# Altium footprint library WE Inductors.PcbLib: 131 footprints (part 4 of 9)
Each footprint in its own frame and in the unit in brackets; x right, y up, seen from the top. Pads: shape width x height; smd on the part's side, far side on the other; paste and mask are expansions set on the pad; w line width, h text height; cw(c..) or ccw(c..) is an arc to the next point about the centre after c.
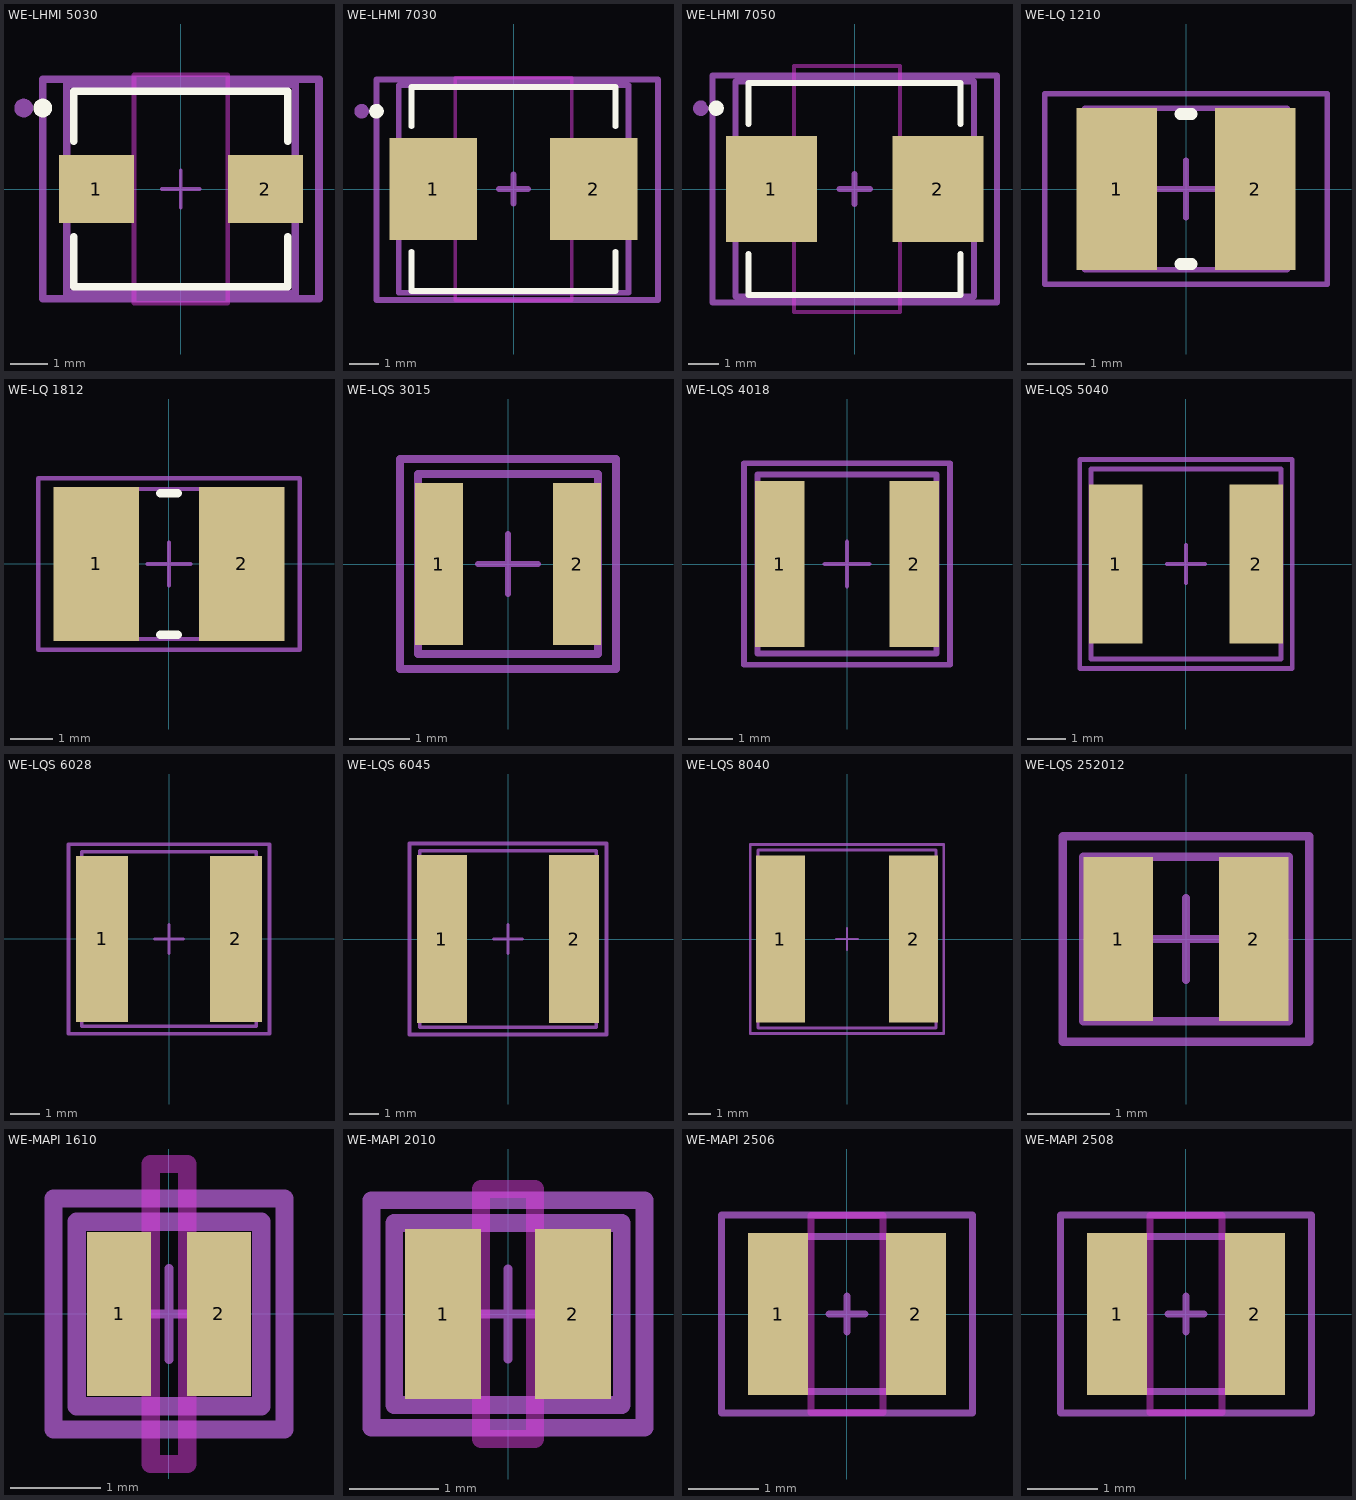
[diagram p3: the footprints below, top view; thin cyan lines are the x and y axes]

## WE-LHMI 5030 [mm] "SMD Inductor, 2-Leads, Body 5.7x 5.2mm"
height 2.8
pads (2):
  rect 2x1.8 smd: 1(-2.25,0) 2(2.25,0)
Top Overlay:
  circle w0.25: c-3.683,2.159 r0.125
  lines w0.2: -2.85,-1.27 -2.85,-2.6 2.85,-2.6 2.85,-1.27 ; -2.85,1.27 -2.85,2.6 2.85,2.6 2.85,1.27
Keep-Out Layer:
  lines w0.127: -1.25,-3.048 -1.25,3.048 1.25,3.048 1.25,-3.048 -1.25,-3.048
Mechanical 13:
  lines w0.2: -3.048,-2.794 3.048,-2.794 3.048,2.794 -3.048,2.794 -3.048,-2.794
Mechanical 15:
  circle w0.25: c-4.191,2.159 r0.125
  lines w0.1: -0.5,0 0.5,0 ; 0,-0.5 0,0.5
  lines w0.2: -3.683,-2.921 -3.683,2.921 3.683,2.921 3.683,-2.921 -3.683,-2.921
  text ".Designator" at 0,0 h0.76
3D body: height 2.8, standoff 0, extent -2.85,-2.6 2.85,2.6

## WE-LHMI 7030 [mm] "SMD Inductor, 2-Leads, Body 7.3 x 6.6mm"
height 2.8
pads (2):
  rect 3x3.5 smd: 1(-2.75,0) 2(2.75,0)
Top Overlay:
  circle w0.25: c-4.699,2.667 r0.125
  lines w0.2: -3.5,-2.15 -3.5,-3.5 3.5,-3.5 3.5,-2.15 ; -3.5,2.15 -3.5,3.5 3.5,3.5 3.5,2.15
Keep-Out Layer:
  lines w0.127: -2,-3.81 -2,3.81 2,3.81 2,-3.81 -2,-3.81
Mechanical 13:
  lines w0.2: -3.937,-3.556 -3.937,3.556 3.937,3.556 3.937,-3.556 -3.937,-3.556
Mechanical 15:
  circle w0.25: c-5.207,2.667 r0.125
  lines w0.2: -0.5,0 0.5,0 ; 0,-0.5 0,0.5 ; -4.699,-3.81 -4.699,3.75 4.953,3.75 4.953,-3.81 -4.699,-3.81
  text ".Designator" at 0,0 h0.76
3D body: height 2.8, standoff 0, extent -3.65,-3.3 3.65,3.3

## WE-LHMI 7050 [mm] "SMD Inductor, 2-Leads, Body 7.3 x 6.6mm"
height 4.8
pads (2):
  rect 3x3.5 smd: 1(-2.75,0) 2(2.75,0)
Top Overlay:
  circle w0.25: c-4.572,2.667 r0.125
  lines w0.2: -3.5,-2.15 -3.5,-3.5 3.5,-3.5 3.5,-2.15 ; -3.5,2.15 -3.5,3.5 3.5,3.5 3.5,2.15
Keep-Out Layer:
  lines w0.127: -2,-4.064 1.5,-4.064 1.5,4.064 -2,4.064 -2,-4.064
Mechanical 13:
  lines w0.2: -3.937,-3.556 3.937,-3.556 3.937,3.556 -3.937,3.556 -3.937,-3.556
Mechanical 15:
  lines w0.2: -0.5,0 0.5,0 ; 0,-0.5 0,0.5 ; -4.699,-3.75 4.699,-3.75 4.699,3.75 -4.699,3.75 -4.699,-3.75
  lines w0.254: -5.023,2.781 ccw(c-5.08,2.667) -4.953,2.667
  text ".Designator" at 0,0 h0.76
3D body: height 4.8, standoff 0, extent -3.65,-3.3 3.65,3.3

## WE-LQ 1210 [mm] "Inductor, 2-Leads, Body 3,2x2,5mm"
height 2.3
pads (2):
  rect 1.4x2.8 smd: 1(-1.2,0) 2(1.2,0)
Top Overlay:
  lines w0.2: -0.1,-1.3 0.1,-1.3 ; -0.1,1.3 0.1,1.3
Mechanical 13:
  lines w0.1: -1.75,-1.4 1.75,-1.4 1.75,1.4 -1.75,1.4 -1.75,-1.4
Mechanical 15:
  lines w0.1: -0.5,0 0.5,0 ; 0,-0.5 0,0.5 ; -2.45,-1.65 2.45,-1.65 2.45,1.65 -2.45,1.65 -2.45,-1.65
3D body: height 1.99, standoff -0.01, extent -1.6,-1.25 1.6,1.25

## WE-LQ 1812 [mm] "Inductor, 2-Leads, Body 4,5x3,2mm"
height 2.9
pads (2):
  rect 2x3.6 smd: 1(-1.7,0) 2(1.7,0)
Top Overlay:
  lines w0.2: -0.2,-1.65 0.2,-1.65 ; -0.2,1.65 0.2,1.65
Mechanical 13:
  lines w0.1: -2.4,-1.75 2.4,-1.75 2.4,1.75 -2.4,1.75 -2.4,-1.75
Mechanical 15:
  lines w0.1: -0.5,0 0.5,0 ; 0,-0.5 0,0.5 ; -3.05,-2 3.05,-2 3.05,2 -3.05,2 -3.05,-2
3D body: height 2.59, standoff -0.01, extent -2.25,-1.6 2.25,1.6

## WE-LQS 3015 [mm] "SMD Power Inductor, 2-Leads, Body 3.0x3.0mm"
height 1.5
pads (2):
  rect 0.8x2.7 smd: 1(-1.15,0) 2(1.15,0)
Mechanical 13:
  lines w0.127: -1.5,-1.5 1.5,-1.5 1.5,1.5 -1.5,1.5 -1.5,-1.5
Mechanical 15:
  lines w0.1: -0.5,0 0.5,0 ; 0,-0.5 0,0.5
  lines w0.127: -1.8,-1.75 -1.8,1.75 1.8,1.75 1.8,-1.75 -1.8,-1.75
3D body: height 1.48, standoff -0.02, extent -1.5,-1.5 1.5,1.5

## WE-LQS 4018 [mm] "SMD Power Inductor, 2-Leads, Body 4.0x4.0mm"
height 1.8
pads (2):
  rect 1.1x3.7 smd: 1(-1.5,0) 2(1.5,0)
Mechanical 13:
  lines w0.127: -2,-2 2,-2 2,2 -2,2 -2,-2
Mechanical 15:
  lines w0.1: -0.5,0 0.5,0 ; 0,-0.5 0,0.5
  lines w0.127: -2.3,-2.25 2.3,-2.25 2.3,2.25 -2.3,2.25 -2.3,-2.25
3D body: height 1.78, standoff -0.02, extent -2,-2 2,2

## WE-LQS 5040 [mm] "SMD Power Inductor, 2-Leads, Body 5.0x5.0mm"
height 4
pads (2):
  rect 1.4x4.2 smd: 1(-1.85,0) 2(1.85,0)
Mechanical 13:
  lines w0.127: -2.5,-2.5 2.5,-2.5 2.5,2.5 -2.5,2.5 -2.5,-2.5
Mechanical 15:
  lines w0.1: -0.5,0 0.5,0 ; 0,-0.5 0,0.5
  lines w0.127: -2.8,-2.75 -2.8,2.75 2.8,2.75 2.8,-2.75 -2.8,-2.75
3D body: height 3.99, standoff -0.01, extent -2.5,-2.5 2.5,2.5

## WE-LQS 6028 [mm] "SMD Power Inductor, 2-Leads, Body 6.0x6.0mm"
height 2.8
pads (2):
  rect 1.8x5.7 smd: 1(-2.3,0) 2(2.3,0)
Mechanical 13:
  lines w0.127: -3,-3 3,-3 3,3 -3,3 -3,-3
Mechanical 15:
  lines w0.1: -0.5,0 0.5,0 ; 0,-0.5 0,0.5
  lines w0.127: -3.45,-3.25 3.45,-3.25 3.45,3.25 -3.45,3.25 -3.45,-3.25
3D body: height 2.79, standoff -0.02, extent -3,-3 3,3

## WE-LQS 6045 [mm] "SMD Power Inductor, 2-Leads, Body 6.0x6.0mm"
height 4.5
pads (2):
  rect 1.7x5.7 smd: 1(-2.25,0) 2(2.25,0)
Mechanical 13:
  lines w0.127: -3,-3 -3,3 3,3 3,-3 -3,-3
Mechanical 15:
  lines w0.1: -0.5,0 0.5,0 ; 0,-0.5 0,0.5
  lines w0.127: -3.35,-3.25 -3.35,3.25 3.35,3.25 3.35,-3.25 -3.35,-3.25
3D body: height 4.47, standoff -0.03, extent -3,-3 3,3

## WE-LQS 8040 [mm] "SMD Power Inductor, 2-Leads, Body 8.0x8.0mm"
height 4.2
pads (2):
  rect 2.2x7.5 smd: 1(-3,0) 2(3,0)
Mechanical 13:
  lines w0.127: -4,-4 4,-4 4,4 -4,4 -4,-4
Mechanical 15:
  lines w0.1: -0.5,0 0.5,0 ; 0,-0.5 0,0.5
  lines w0.127: -4.35,-4.25 -4.35,4.25 4.35,4.25 4.35,-4.25 -4.35,-4.25
3D body: height 4.16, standoff -0.04, extent -4,-4 4,4

## WE-LQS 252012 [mm] "SMD Power Inductor, 2-Leads, Body 2.5x2.0mm"
height 1.2
pads (2):
  rect 0.85x2 smd: 1(-0.825,0) 2(0.825,0)
Mechanical 13:
  lines w0.1: -1.25,-1 1.25,-1 1.25,1 -1.25,1 -1.25,-1
Mechanical 15:
  lines w0.1: -0.5,0 0.5,0 ; 0,-0.5 0,0.5 ; -1.5,-1.25 1.5,-1.25 1.5,1.25 -1.5,1.25 -1.5,-1.25
3D body: height 1.18, standoff -0.02, extent -1.25,-1 1.25,1

## WE-MAPI 1610 [mm] "Chip Inductor, 2-Leads, Body 1.6x 1.6mm,IPC Medium Density"
height 1
pads (2):
  rect 0.7x1.8 smd: 1(-0.55,0) 2(0.55,0)
Keep-Out Layer:
  lines w0.2: -0.2,-1.651 0.2,-1.651 0.2,1.651 -0.2,1.651 -0.2,-1.651
Mechanical 13:
  lines w0.2: -1.016,-1.016 -1.016,1.016 1.016,1.016 1.016,-1.016 -1.016,-1.016
Mechanical 15:
  lines w0.1: -0.5,0 0.5,0 ; 0,-0.5 0,0.5
  lines w0.2: -1.27,-1.27 -1.27,1.27 1.27,1.27 1.27,-1.27 -1.27,-1.27
  text ".Designator" at 0,0 h0.76
3D body: height 1, standoff 0, extent -0.8,-0.8 0.8,0.8

## WE-MAPI 2010 [mm] "Chip Inductor, 2-Leads, Body 2.5x 1.6mm,IPC Medium Density"
height 1
pads (2):
  rect 0.85x1.9 smd: 1(-0.725,0) 2(0.725,0)
Keep-Out Layer:
  lines w0.2: -0.3,-1.397 -0.3,1.397 0.3,1.397 0.3,-1.397 -0.3,-1.397
Mechanical 13:
  lines w0.2: -1.27,-1.016 -1.27,1.016 1.27,1.016 1.27,-1.016 -1.27,-1.016
Mechanical 15:
  lines w0.1: -0.5,0 0.5,0 ; 0,-0.5 0,0.5
  lines w0.2: -1.524,-1.27 -1.524,1.27 1.524,1.27 1.524,-1.27 -1.524,-1.27
  text ".Designator" at 0,0 h0.76
3D body: height 1, standoff 0, extent -1,-0.8 1,0.8

## WE-MAPI 2506 [mm] "Chip Inductor, 2-Leads, Body 2.5x2.0mm, IPC Medium Density"
height 0.6
pads (2):
  rect 0.85x2.3 smd: 1(-0.975,0) 2(0.975,0)
Keep-Out Layer:
  lines w0.1: -0.508,-1.397 -0.508,1.397 0.508,1.397 0.508,-1.397 -0.508,-1.397
Mechanical 13:
  lines w0.1: -1.35,-1.1 1.35,-1.1 1.35,1.1 -1.35,1.1 -1.35,-1.1
Mechanical 15:
  lines w0.1: -0.254,0 0.254,0 ; 0,-0.254 0,0.254 ; -1.778,-1.4 1.778,-1.4 1.778,1.4 -1.778,1.4 -1.778,-1.4
  text ".Designator" at 0,0 h0.76
3D body: height 0.6, standoff 0, extent -1.25,-1 1.25,1

## WE-MAPI 2508 [mm] "Chip Inductor, 2-Leads, Body 2.5x2.0mm, IPC Medium Density"
height 0.8
pads (2):
  rect 0.85x2.3 smd: 1(-0.975,0) 2(0.975,0)
Keep-Out Layer:
  lines w0.1: -0.508,-1.397 0.508,-1.397 0.508,1.397 -0.508,1.397 -0.508,-1.397
Mechanical 13:
  lines w0.1: -1.35,-1.1 -1.35,1.1 1.35,1.1 1.35,-1.1 -1.35,-1.1
Mechanical 15:
  lines w0.1: -0.254,0 0.254,0 ; 0,-0.254 0,0.254 ; -1.778,-1.4 -1.778,1.4 1.778,1.4 1.778,-1.4 -1.778,-1.4
  text ".Designator" at 0,0 h0.76
3D body: height 0.8, standoff 0, extent -1.25,-1 1.25,1